# Altium footprint library AMDC.PcbLib: 96 footprints (part 2 of 6)
Each footprint in its own frame and in the unit in brackets; x right, y up, seen from the top. Pads: shape width x height; smd on the part's side, far side on the other; paste and mask are expansions set on the pad; w line width, h text height; cw(c..) or ccw(c..) is an arc to the next point about the centre after c.
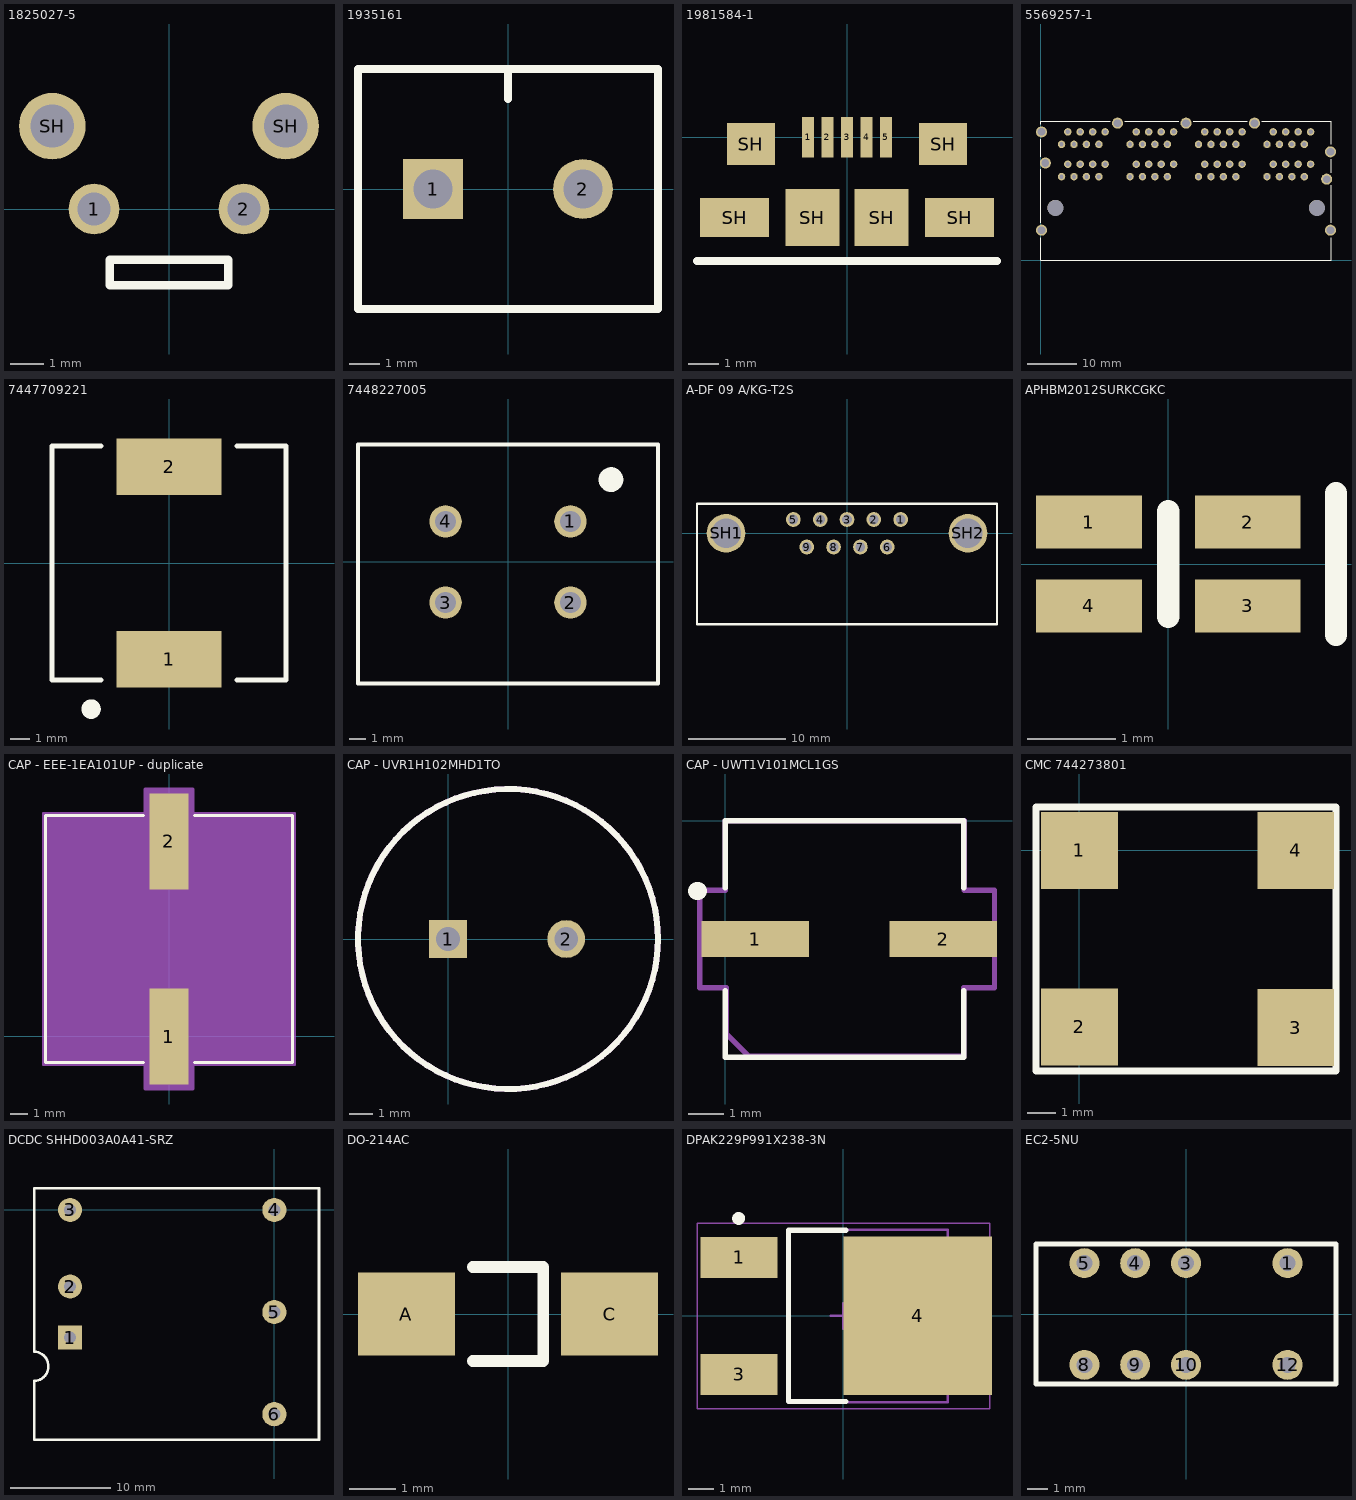
[diagram p1: the footprints below, top view; thin cyan lines are the x and y axes]

## 1825027-5 [mm] "SWITCH TACTILE SPST-NO 0.05A 24V"
pads (4):
  round 1.524 hole 0.991: 1(-2.25,0) 2(2.25,0)
  round 2 hole 1.295: SH(-3.505,2.49) SH(3.505,2.49)
Top Overlay:
  lines w0.254: -1.778,-2.286 -1.778,-1.524 1.778,-1.524 1.778,-2.286 -1.778,-2.286
3D body "c-1825027-2-g-3d.stp": height 7, standoff -3.52, extent -4.204,-3.059 4.204,4.091

## 1935161 [mm] "TERM BLOCK PCB 2POS 5.0MM GREEN"
height 11.4
pads (2):
  rect 2x2 hole 1.3: 1(-2.5,0)
  round 2 hole 1.3: 2(2.5,0)
Top Overlay:
  lines w0.254: 0,3 0,4 ; -5,-4 5,-4 5,4 -5,4 -5,-4
3D body "1935161--3DModel-STEP-56544.STEP": height 11.5, standoff -3.4, extent -5.4,-4 5,5

## 1981584-1 [mm] "CONN RCPT MICRO USB TYPE AB"
height 2.51
pads (11):
  rect 0.4x1.35 smd: 1(-1.3,0) 2(-0.65,0) 3(0,0) 4(0.65,0) 5(1.3,0)
  rect 2.3x1.3 smd: SH(-3.75,-2.675) SH(3.75,-2.675)
  rect 1.6x1.4 smd: SH(-3.2,-0.225) SH(3.2,-0.225)
  rect 1.8x1.9 smd: SH(-1.15,-2.675) SH(1.15,-2.675)
Top Overlay:
  lines w0.254: -5,-4.125 5,-4.125
3D body "MicroAB.STEP": height 2.76, standoff -0.24, extent -4.375,-5.475 4.425,0.125
3D body: height 12.53, standoff -3.85, extent 2.5,1.925 2.5,1.925

## 5569257-1 [mil] "CONN MOD JACK 8P8C R/A SHIELDED"
height 994.88
pads (75):
  round 60 hole 35.04: 1A(515.02,1029.6) 1B(1065.02,1029.6) 1C(1615.02,1029.6) 1D(2165.02,1029.6) 1E(165.02,669.76) 1F(715.02,669.76) 1G(1265.02,669.76) 1H(1815.02,669.76) 2A(415.02,1029.6) 2B(965.02,1029.6) 2C(1515.02,1029.6) 2D(2065.02,1029.6) 2E(265.02,669.76) 2F(815.02,669.76) 2G(1365.02,669.76) 2H(1915.02,669.76) 3A(315.02,1029.6) 3B(865.02,1029.6) 3C(1415.02,1029.6) 3D(1965.02,1029.6) 3E(365.02,669.76) 3F(915.02,669.76) 3G(1465.02,669.76) 3H(2015.02,669.76) 4A(215.02,1029.6) 4B(765.02,1029.6) 4C(1315.02,1029.6) 4D(1865.02,1029.6) 4E(465.02,669.76) 4F(1015.02,669.76) 4G(1565.02,669.76) 4H(2115.02,669.76) 5A(465.02,929.6) 5B(1015.02,929.6) 5C(1565.02,929.6) 5D(2115.02,929.6) 5E(215.02,769.76) 5F(765.02,769.76) 5G(1315.02,769.76) 5H(1865.02,769.76) 6A(365.02,929.6) 6B(915.02,929.6) 6C(1465.02,929.6) 6D(2015.02,929.6) 6E(315.02,769.76) 6F(865.02,769.76) 6G(1415.02,769.76) 6H(1965.02,769.76) 7A(265.02,929.6) 7B(815.02,929.6) 7C(1365.02,929.6) 7D(1915.02,929.6) 7E(415.02,769.76) 7F(965.02,769.76) 7G(1515.02,769.76) 7H(2065.02,769.76) 8A(165.02,929.6) 8B(715.02,929.6) 8C(1265.02,929.6) 8D(1815.02,929.6) 8E(515.02,769.76) 8F(1065.02,769.76) 8G(1615.02,769.76) 8H(2165.02,769.76)
  round 88.58 hole 61.81: SH1(4.19,239.83) SH2(35.1,779.6) SH3(4.19,1029.6) SH4(615.02,1099.68) SH5(1165.02,1099.68) SH6(1715.02,1099.68) SH7(2324.86,869.76) SH8(2293.96,649.68) SH9(2324.86,239.83)
  round 127.95 hole 127.95: ""(115.02,419.76) ""(2215.02,419.76)
Top Overlay:
  lines w10: -0.98,179.76 -0.98,67.69 -0.98,-2.24 2329.02,-2.24 2329.02,67.69 2329.02,179.76 ; -0.98,299.76 -0.98,434.07 -0.98,729.76 ; -0.98,829.76 -0.98,969.76 ; -0.98,1089.76 -0.98,1116.76 554.53,1116.76 ; 674.53,1116.76 1104.53,1116.76 ; 1224.53,1116.76 1654.53,1116.76 ; 1774.53,1116.76 2329.02,1116.76 2329.02,1046.82 2329.02,929.6 ; 2329.02,299.76 2329.02,427.26 2329.02,491.01 2329.02,599.76 ; 2329.02,699.76 2329.02,809.76
3D body "c-5569257-1-a1-3d.stp": height 1000.26, standoff -159.74, extent 0,0 2330,1120

## 7447709221 [mm] "FIXED IND 220UH 1.8A 300 MOHM"
pads (2):
  rect 5.4x2.9 smd: 1(0,-4.95) 2(0,4.95)
Top Overlay:
  circle w0.5: c-4,-7.5 r0.25
  lines w0.254: -3.5,-6 -6,-6 -6,6 -3.5,6 ; 3.5,-6 6,-6 6,6 3.5,6
3D body "7447709001_Download_STP_WE-PD-1210_rev1.stp": height 9.46, standoff 0, extent -6,-6 6,6

## 7448227005 [mm] "CMC 450UH 6.5A 2LN TH"
height 22
pads (4):
  round 2 hole 1.3: 1(3.85,2.5) 2(3.85,-2.5) 3(-3.85,-2.5) 4(-3.85,2.5)
Top Overlay:
  circle w0.762: c6.35,5.08 r0.381
  lines w0.254: -9.25,-7.5 -9.25,7.25 9.25,7.25 9.25,-7.5 -9.25,-7.5

## A-DF 09 A/KG-T2S [mm] "CONN D-SUB RCPT 9POS R/A SOLDER"
height 12.55
pads (11):
  round 1.524 hole 1: 1(5.54,1.42) 2(2.77,1.42) 3(0,1.42) 4(-2.77,1.42) 5(-5.54,1.42) 6(4.155,-1.42) 7(1.385,-1.42) 8(-1.385,-1.42) 9(-4.155,-1.42)
  round 4 hole 3.05: SH1(-12.495,0) SH2(12.495,0)
Top Overlay:
  lines w0.254: -15.494,-9.398 15.494,-9.398 15.494,0 15.494,3.048 -15.494,3.048 -15.494,0 -15.494,-9.398
3D body "connector_a-df_09_a_kg-t2.stp": height 12.57, standoff -4.3, extent -15.4,-15.325 15.41,2.975

## APHBM2012SURKCGKC [mm] "LED GREEN/RED CLEAR 2012 SMD"
pads (4):
  rect 1.2x0.6 smd: 1(-0.9,0.475) 2(0.9,0.475) 3(0.9,-0.475) 4(-0.9,-0.475)
Top Overlay:
  lines w0.254: 0,-0.6 0,0.6 ; 1.9,-0.8 1.9,0.8
3D body "APHBM2012.STEP": height 0.48, standoff 0.02, extent -1,-0.625 1,0.625

## CAP - EEE-1EA101UP - duplicate [mil] "100uF Cap"
pads (2):
  rect 87x213 smd: 1(-1,-1) 2(-1,433)
Top Overlay:
  lines w6: -57.6,-58.5 -275.5,-58.5 -275.5,490.5 -57.6,490.5 ; 55.6,-58.5 273.5,-58.5 273.5,490.5 55.6,490.5
Mechanical 15:
  region: 52.5,-63.5 52.5,-117.5 -54.5,-117.5 -54.5,-63.5 -280.5,-63.5 -280.5,495.5 -54.5,495.5 -54.5,549.5 52.5,549.5 52.5,495.5 278.5,495.5 278.5,-63.5
  lines w6: -280.5,-63.5 -280.5,495.5 -54.5,495.5 -54.5,549.5 52.5,549.5 52.5,495.5 278.5,495.5 278.5,-63.5 52.5,-63.5 52.5,-117.5 -54.5,-117.5 -54.5,-63.5 -280.5,-63.5
3D body "CAP_EEFK_H13.stp": height 553, standoff 0, extent -270.5,-84 268.5,507

## CAP - UVR1H102MHD1TO [mm] "CAP ALUM 1000UF 20% 50V RADIAL"
pads (2):
  rect 1.6x1.6 hole 1: 1(0,0)
  round 1.6 hole 1: 2(5.004,0)
Top Overlay:
  circle w0.254: c2.54,0 r6.35
  text "." at -5.334,-0.508 h10
Mechanical 1:
  circle w0.254: c2.54,0 r6.35
3D body "cap-uvr1h102mhd1to.step": height 25.01, standoff -2.7, extent -3.75,-6.25 8.76,6.25
3D body: height 22.38, standoff -12.57, extent -3.6,-6.475 -3.6,-6.475

## CAP - UWT1V101MCL1GS [mm] "100uF cap"
pads (2):
  rect 3x1 smd: 1(0.838,-3.302) 2(6.088,-3.302)
Top Overlay:
  lines w0.152: 0,-4.74 0,-6.602 6.629,-6.602 ; 0,-1.864 0,-0.002 6.6,-0.002 ; 6.655,-6.602 6.655,-4.74 ; 6.655,-1.864 6.655,-0.002
  lines w0.5: -0.787,-1.956 -0.762,-1.956
Mechanical 15:
  lines w0.152: -0.711,-4.661 0.025,-4.661 0.025,-5.944 0.66,-6.579 6.655,-6.579 6.655,-4.661 7.518,-4.661 7.518,-1.943 6.68,-1.943 6.68,0 0,0 0,-1.943 -0.711,-1.943 -0.711,-4.661
3D body: height 7.7, standoff 0, extent 0.19,-6.436 6.49,-0.142

## CMC 744273801 [mm] "CMC 9UH 3.5A 2LN 800 OHM SMD"
pads (4):
  rect 2.7x2.7 smd: 1(0,0) 2(0,-6.2) 3(7.6,-6.223) 4(7.6,0)
Top Overlay:
  lines w0.254: -1.524,-7.747 -1.524,1.524 9.017,1.524 9.017,-7.747 -1.524,-7.747
  text "." at -0.508,1.905 h10
3D body "STEP-WE-SL5-HC-rev1.stp": height 5.3, standoff 0, extent -0.889,-7.452 8.611,0.848

## DCDC SHHD003A0A41-SRZ [mm] "DC/DC CONVERTER 15W 5V 3A"
pads (6):
  rect 2.4x2.4 hole 1.2: 1(-20.32,-12.7)
  round 2.4 hole 1.2: 2(-20.32,-7.62) 3(-20.32,0) 4(0,0) 5(0,-10.16) 6(0,-20.32)
Top Overlay:
  lines w0.254: -23.876,-22.86 -23.876,-17.018 ccw(c-23.939,-15.557) -23.876,-14.097 -23.876,2.159 4.445,2.159 4.445,-22.86 -23.876,-22.86

## DO-214AC [mm]
pads (2):
  rect 2.1x1.8 smd: A(-2.2,0) C(2.2,0)
Top Overlay:
  lines w0.254: -0.762,-1.016 0.762,-1.016 0.762,1.016 -0.762,1.016

## DPAK229P991X238-3N [mm] "D-PAK, 3-Pads, Body 6.21x6.73mm (max), IPC Medium Density"
height 2.38
pads (3):
  rect 3x1.6 smd: 1(-4.08,2.285) 3(-4.08,-2.285)
  rect 5.8x6.2 smd: 4(2.9,0)
Top Overlay:
  circle w0.25: c-4.1,3.81 r0.125
  lines w0.2: 0.1,-3.35 -2.15,-3.35 -2.15,3.35 0.1,3.35
Mechanical 13:
  lines w0.1: -2.15,-3.375 -2.15,3.375 4.07,3.375 4.07,-3.375 -2.15,-3.375
Mechanical 15:
  lines w0.05: -5.725,-3.625 -5.725,3.625 5.725,3.625 5.725,-3.625 -5.725,-3.625
  lines w0.1: -0.5,0 0.5,0 ; 0,-0.5 0,0.5
3D body "DPAK229P991X238-3N.step": height 2.38, standoff 0, extent -5.162,-3.375 4.753,3.375

## EC2-5NU [mm] "RELAY GEN PURPOSE DPDT 2A 250V"
pads (8):
  round 1.5 hole 0.8: 1(5.08,2.54) 3(0,2.54) 4(-2.54,2.54) 5(-5.08,2.54) 8(-5.08,-2.54) 9(-2.54,-2.54) 10(0,-2.54) 12(5.08,-2.54)
Top Overlay:
  lines w0.254: -7.5,-3.5 -7.5,3.5 0,3.5 7.5,3.5 7.5,-3.5 0,-3.5 -7.5,-3.5